# Altium footprint library WR-TBL_Rising Cage Clamp.PcbLib: 435 footprints (part 26 of 28)
Each footprint in its own frame and in the unit in brackets; x right, y up, seen from the top. Pads: shape width x height; smd on the part's side, far side on the other; paste and mask are expansions set on the pad; w line width, h text height; cw(c..) or ccw(c..) is an arc to the next point about the centre after c.
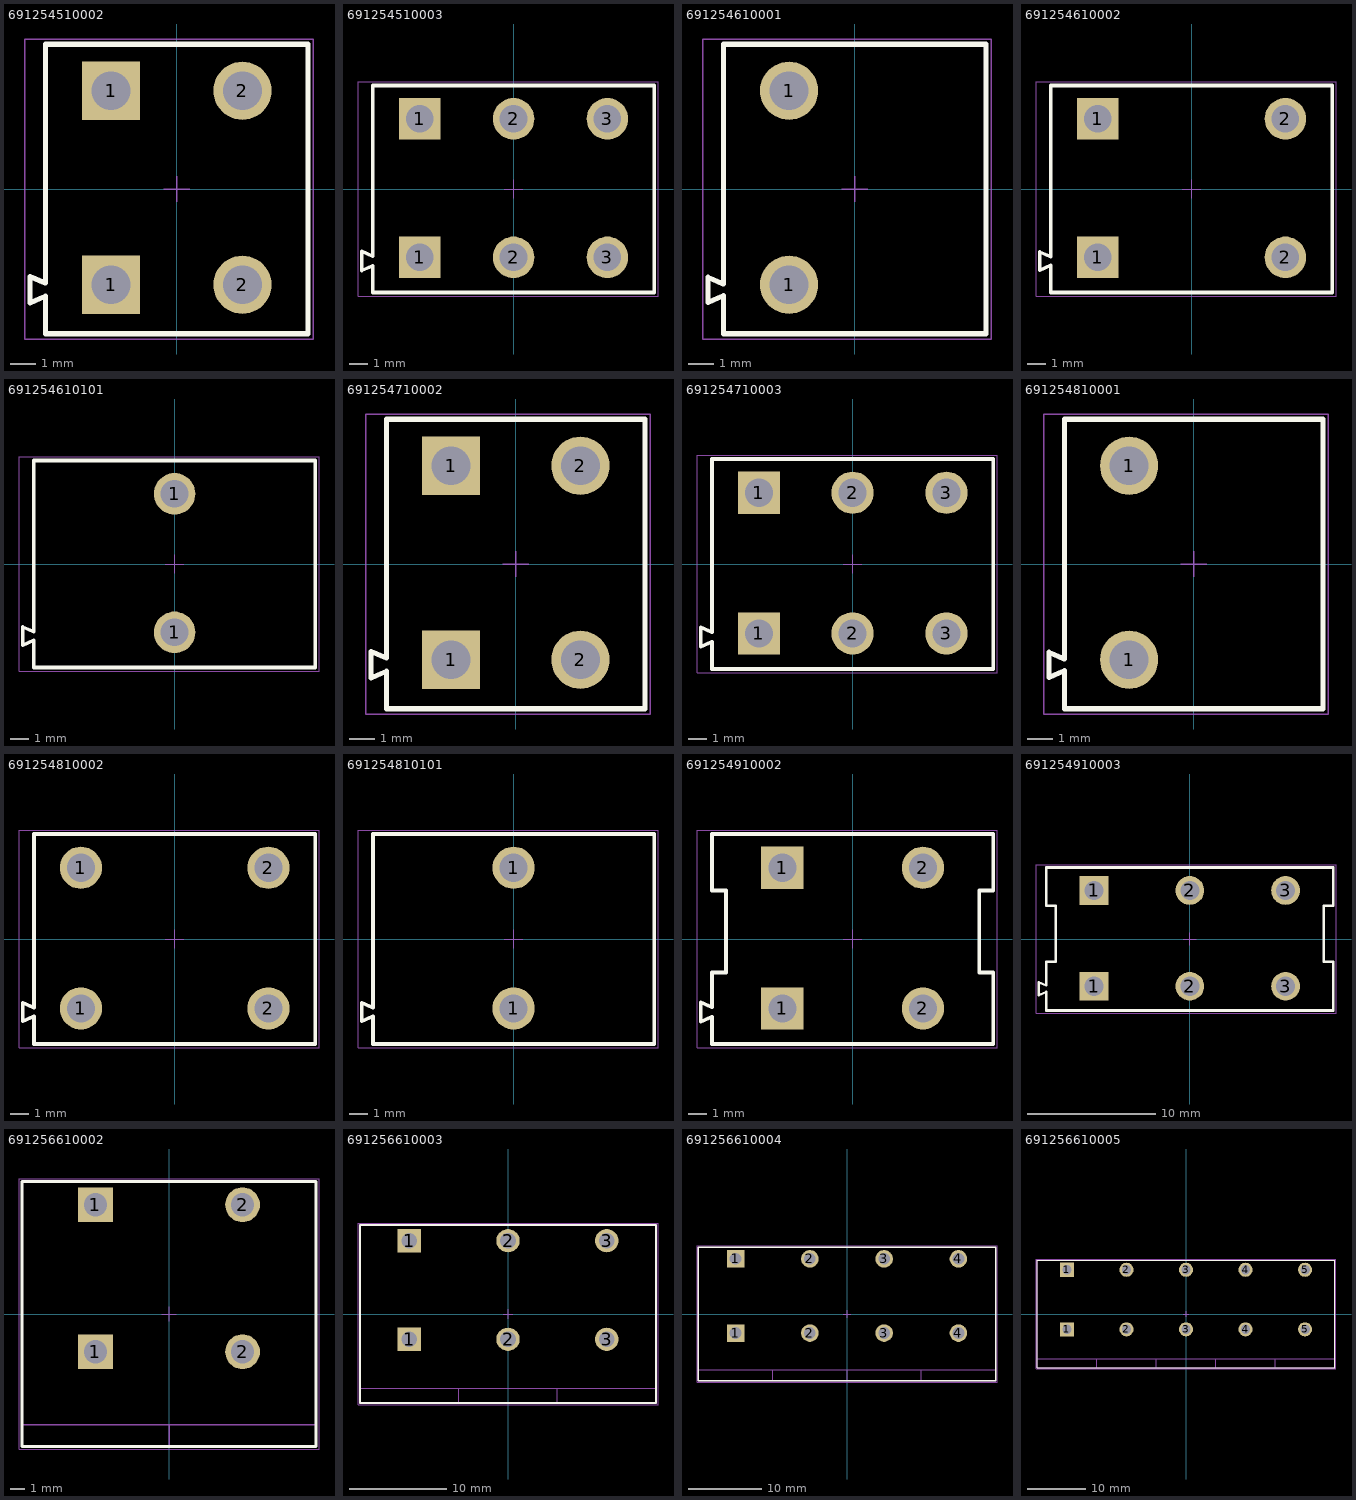
[diagram p25: the footprints below, top view; thin cyan lines are the x and y axes]

## 691254510002 [mm] "Serie 2545-5.08mm Horizontal Cable Entry with Rising Cage Clamp, 2 pins"
height 18
pads (4):
  rect 2.25x2.25 hole 1.5: 1(-2.54,-3.7) 1(-2.54,3.8)
  round 2.25 hole 1.5: 2(2.54,-3.7) 2(2.54,3.8)
Top Overlay:
  lines w0.2: -5.08,-5.6 -5.08,-4.15 -5.68,-4.41 -5.68,-3.38 -5.08,-3.64 -5.08,5.6 5.08,5.6 5.08,-5.6 -5.08,-5.6
Mechanical 13:
  lines w0.1: -5.08,-5.6 -5.08,-4.15 -5.68,-4.41 -5.68,-3.38 -5.08,-3.64 -5.08,5.6 5.08,5.6 5.08,-5.6 -5.08,-5.6
Mechanical 15:
  lines w0.05: -0.5,0 0.5,0 ; 0,-0.5 0,0.5 ; -5.88,-5.8 -5.88,5.8 5.28,5.8 5.28,-5.8 -5.88,-5.8
3D body "691254510002.stp": height 18.1, standoff -3.4, extent -5.68,-5.6 5.08,5.6

## 691254510003 [mm] "Serie 2545-5.08mm Horizontal Cable Entry with Rising Cage Clamp, 3 pins"
height 18
pads (6):
  rect 2.25x2.25 hole 1.5: 1(-5.08,-3.7) 1(-5.08,3.8)
  round 2.25 hole 1.5: 2(0,-3.7) 2(0,3.8) 3(5.08,-3.7) 3(5.08,3.8)
Top Overlay:
  lines w0.2: -7.62,-5.6 -7.62,-4.15 -8.22,-4.41 -8.22,-3.38 -7.62,-3.64 -7.62,5.6 7.62,5.6 7.62,-5.6 -7.62,-5.6
Mechanical 13:
  lines w0.1: -7.62,-5.6 -7.62,-4.15 -8.22,-4.41 -8.22,-3.38 -7.62,-3.64 -7.62,5.6 7.62,5.6 7.62,-5.6 -7.62,-5.6
Mechanical 15:
  lines w0.05: -0.5,0 0.5,0 ; 0,-0.5 0,0.5 ; -8.42,-5.8 7.82,-5.8 7.82,5.8 -8.42,5.8 -8.42,-5.8
3D body "691254510003.stp": height 18.1, standoff -3.4, extent -8.22,-5.6 7.62,5.6

## 691254610001 [mm] "Serie 2546-10.16mm Horizontal Cable Entry with Rising Cage Clamp, 1 pin"
height 18
pads (2):
  round 2.25 hole 1.5: 1(-2.54,-3.7) 1(-2.54,3.8)
Top Overlay:
  lines w0.2: -5.081,-4.127 -5.68,-4.39 -5.68,-3.41 -5.081,-3.673 -5.081,5.599 ; -5.08,-4.13 -5.08,-5.6 5.08,-5.6 5.08,5.6 -5.08,5.6
Mechanical 13:
  lines w0.1: -5.081,-4.127 -5.68,-4.39 -5.68,-3.41 -5.081,-3.673 -5.081,5.599 ; -5.08,-4.13 -5.08,-5.6 5.08,-5.6 5.08,5.6 -5.08,5.6
Mechanical 15:
  lines w0.05: -0.5,0 0.5,0 ; 0,-0.5 0,0.5 ; -5.88,-5.8 5.28,-5.8 5.28,5.8 -5.88,5.8 -5.88,-5.8
3D body "691254610001.stp": height 18.1, standoff -3.4, extent -5.68,-5.6 5.08,5.6

## 691254610002 [mm] "Serie 2546-10.16mm Horizontal Cable Entry with Rising Cage Clamp, 2 pins"
height 18
pads (4):
  rect 2.25x2.25 hole 1.5: 1(-5.08,-3.7) 1(-5.08,3.8)
  round 2.25 hole 1.5: 2(5.08,-3.7) 2(5.08,3.8)
Top Overlay:
  lines w0.2: -7.621,-4.127 -8.22,-4.39 -8.22,-3.41 -7.621,-3.673 -7.621,5.599 ; -7.62,-4.13 -7.62,-5.6 7.62,-5.6 7.62,5.6 -7.62,5.6
Mechanical 13:
  lines w0.1: -7.621,-4.127 -8.22,-4.39 -8.22,-3.41 -7.621,-3.673 -7.621,5.599 ; -7.62,-4.13 -7.62,-5.6 7.62,-5.6 7.62,5.6 -7.62,5.6
Mechanical 15:
  lines w0.05: -0.5,0 0.5,0 ; 0,-0.5 0,0.5 ; -8.42,-5.8 -8.42,5.8 7.82,5.8 7.82,-5.8 -8.42,-5.8
3D body "691254610002.stp": height 18.1, standoff -3.4, extent -8.22,-5.6 7.62,5.6

## 691254610101 [mm] "Serie 2546-10.16mm Horizontal Cable Entry with Rising Cage Clamp, 1 pin"
height 18
pads (2):
  round 2.25 hole 1.5: 1(0,-3.7) 1(0,3.8)
Top Overlay:
  lines w0.2: -7.621,-4.127 -8.22,-4.39 -8.22,-3.41 -7.621,-3.673 -7.621,5.599 ; -7.62,-4.13 -7.62,-5.6 7.62,-5.6 7.62,5.6 -7.62,5.6
Mechanical 13:
  lines w0.1: -7.621,-4.127 -8.22,-4.39 -8.22,-3.41 -7.621,-3.673 -7.621,5.599 ; -7.62,-4.13 -7.62,-5.6 7.62,-5.6 7.62,5.6 -7.62,5.6
Mechanical 15:
  lines w0.05: -0.5,0 0.5,0 ; 0,-0.5 0,0.5 ; -8.42,-5.8 7.82,-5.8 7.82,5.8 -8.42,5.8 -8.42,-5.8
3D body "691254610101.stp": height 18.1, standoff -3.4, extent -8.22,-5.6 7.62,5.6

## 691254710002 [mm] "Serie 2547-5.00mm Horizontal Cable Entry with Rising Cage Clamp, 2 pins"
height 18
pads (4):
  rect 2.25x2.25 hole 1.5: 1(-2.5,-3.7) 1(-2.5,3.8)
  round 2.25 hole 1.5: 2(2.5,-3.7) 2(2.5,3.8)
Top Overlay:
  lines w0.2: -5.6,-4.41 -5,-4.15 -5,-5.6 5,-5.6 5,5.6 -5,5.6 -5,-3.64 -5.6,-3.38 -5.6,-4.41
Mechanical 13:
  lines w0.1: -5.6,-4.41 -5.6,-3.38 -5,-3.64 -5,5.6 5,5.6 5,-5.6 -5,-5.6 -5,-4.15 -5.6,-4.41
Mechanical 15:
  lines w0.05: -0.5,0 0.5,0 ; 0,-0.5 0,0.5 ; -5.8,-5.8 -5.8,5.8 5.2,5.8 5.2,-5.8 -5.8,-5.8
3D body "691254710002.stp": height 18.05, standoff -3.45, extent -5.6,-5.6 5,5.6

## 691254710003 [mm] "Serie 2547-5.00mm Horizontal Cable Entry with Rising Cage Clamp, 3 pins"
height 18
pads (6):
  rect 2.25x2.25 hole 1.5: 1(-5,-3.7) 1(-5,3.8)
  round 2.25 hole 1.5: 2(0,-3.7) 2(0,3.8) 3(5,-3.7) 3(5,3.8)
Top Overlay:
  lines w0.2: -8.1,-4.41 -8.1,-3.38 -7.5,-3.64 -7.5,5.6 7.5,5.6 7.5,-5.6 -7.5,-5.6 -7.5,-4.15 -8.1,-4.41
Mechanical 13:
  lines w0.1: -8.1,-4.41 -7.5,-4.15 -7.5,-5.6 7.5,-5.6 7.5,5.6 -7.5,5.6 -7.5,-3.64 -8.1,-3.38 -8.1,-4.41
Mechanical 15:
  lines w0.05: -0.5,0 0.5,0 ; 0,-0.5 0,0.5 ; -8.3,-5.8 7.7,-5.8 7.7,5.8 -8.3,5.8 -8.3,-5.8
3D body "691254710003.stp": height 18.05, standoff -3.45, extent -8.1,-5.6 7.5,5.6

## 691254810001 [mm] "Serie 2548-10.00mm Horizontal Cable Entry with Rising Cage Clamp, 1 pin"
height 18
pads (2):
  round 2.25 hole 1.5: 1(-2.5,-3.7) 1(-2.5,3.8)
Top Overlay:
  lines w0.2: -5.001,-4.128 -5.6,-4.39 -5.6,-3.41 -5.001,-3.672 -5.001,5.599 5,5.6 5,-5.6 -5,-5.6 -5,-4.13
Mechanical 13:
  lines w0.1: -5.001,-4.128 -5.6,-4.39 -5.6,-3.41 -5.001,-3.672 -5.001,5.599 5,5.6 5,-5.6 -5,-5.6 -5,-4.13
Mechanical 15:
  lines w0.05: -0.5,0 0.5,0 ; 0,-0.5 0,0.5 ; -5.8,-5.8 -5.8,5.8 5.2,5.8 5.2,-5.8 -5.8,-5.8
3D body "691254810001.stp": height 18.1, standoff -3.4, extent -5.6,-5.6 5,5.6

## 691254810002 [mm] "Serie 2548-10.00mm Horizontal Cable Entry with Rising Cage Clamp, 2 pins"
height 18
pads (4):
  round 2.25 hole 1.5: 1(-5,-3.7) 1(-5,3.8) 2(5,-3.7) 2(5,3.8)
Top Overlay:
  lines w0.2: -7.5,-4.13 -7.5,-5.6 7.5,-5.6 7.5,5.6 -7.5,5.6 -7.5,-3.672 -8.1,-3.41 -8.1,-4.39 -7.501,-4.128
Mechanical 13:
  lines w0.1: -7.5,-4.13 -7.5,-5.6 7.5,-5.6 7.5,5.6 -7.501,5.6 -7.501,-3.672 -8.1,-3.41 -8.1,-4.39 -7.501,-4.128
Mechanical 15:
  lines w0.05: -0.5,0 0.5,0 ; 0,-0.5 0,0.5 ; -8.3,-5.8 7.7,-5.8 7.7,5.8 -8.3,5.8 -8.3,-5.8
3D body "691254810002.stp": height 18.1, standoff -3.4, extent -8.1,-5.6 7.5,5.6

## 691254810101 [mm] "Serie 2548-10.00mm Horizontal Cable Entry with Rising Cage Clamp, 1 pin"
height 18
pads (2):
  round 2.25 hole 1.5: 1(0,-3.7) 1(0,3.8)
Top Overlay:
  lines w0.2: -7.5,-4.13 -7.5,-5.6 7.5,-5.6 7.5,5.6 -7.5,5.6 -7.5,-3.672 -8.1,-3.41 -8.1,-4.39 -7.501,-4.128
Mechanical 13:
  lines w0.1: -7.5,-4.13 -7.5,-5.6 7.5,-5.6 7.5,5.6 -7.501,5.6 -7.501,-3.672 -8.1,-3.41 -8.1,-4.39 -7.501,-4.128
Mechanical 15:
  lines w0.05: -0.5,0 0.5,0 ; 0,-0.5 0,0.5 ; -8.3,-5.8 -8.3,5.8 7.7,5.8 7.7,-5.8 -8.3,-5.8
3D body "691254810101.stp": height 18.1, standoff -3.4, extent -8.1,-5.6 7.5,5.6

## 691254910002 [mm] "Serie 2549-7.50mm Horizontal Cable Entry with Rising Cage Clamp, 2 pins"
height 18
pads (4):
  rect 2.25x2.25 hole 1.5: 1(-3.75,-3.7) 1(-3.75,3.8)
  round 2.25 hole 1.5: 2(3.75,-3.7) 2(3.75,3.8)
Top Overlay:
  lines w0.2: -8.1,-4.41 -8.1,-3.38 -7.5,-3.64 -7.5,-1.79 -6.75,-1.79 -6.75,2.59 -7.5,2.59 -7.5,5.6 7.5,5.6 7.5,2.59 6.75,2.59 6.75,-1.79 7.5,-1.79 7.5,-5.6 -7.5,-5.6 -7.5,-4.15 -8.1,-4.41
Mechanical 13:
  lines w0.1: -8.1,-4.41 -7.5,-4.15 -7.5,-5.6 7.5,-5.6 7.5,-1.79 6.75,-1.79 6.75,2.59 7.5,2.59 7.5,5.6 -7.5,5.6 -7.5,2.59 -6.75,2.59 -6.75,-1.79 -7.5,-1.79 -7.5,-3.64 -8.1,-3.38 -8.1,-4.41
Mechanical 15:
  lines w0.05: -0.5,0 0.5,0 ; 0,-0.5 0,0.5 ; -8.3,-5.8 -8.3,5.8 7.7,5.8 7.7,-5.8 -8.3,-5.8
3D body "691254910002.stp": height 18.1, standoff -3.4, extent -8.1,-5.6 7.5,5.6

## 691254910003 [mm] "Serie 2549-7.50mm Horizontal Cable Entry with Rising Cage Clamp, 3 pins"
height 18
pads (6):
  rect 2.25x2.25 hole 1.5: 1(-7.5,-3.7) 1(-7.5,3.8)
  round 2.25 hole 1.5: 2(0,-3.7) 2(0,3.8) 3(7.5,-3.7) 3(7.5,3.8)
Top Overlay:
  lines w0.2: -11.85,-4.41 -11.25,-4.15 -11.25,-5.6 11.25,-5.6 11.25,-1.79 10.5,-1.79 10.5,2.59 11.25,2.59 11.25,5.6 -11.25,5.6 -11.25,2.59 -10.5,2.59 -10.5,-1.79 -11.25,-1.79 -11.25,-3.64 -11.85,-3.38 -11.85,-4.41
Mechanical 13:
  lines w0.1: -11.85,-4.41 -11.85,-3.38 -11.25,-3.64 -11.25,-1.79 -10.5,-1.79 -10.5,2.59 -11.25,2.59 -11.25,5.6 11.25,5.6 11.25,2.59 10.5,2.59 10.5,-1.79 11.25,-1.79 11.25,-5.6 -11.25,-5.6 -11.25,-4.15 -11.85,-4.41
Mechanical 15:
  lines w0.05: -0.5,0 0.5,0 ; 0,-0.5 0,0.5 ; -12.05,-5.8 11.45,-5.8 11.45,5.8 -12.05,5.8 -12.05,-5.8
3D body "691254910003.stp": height 18.1, standoff -3.4, extent -11.85,-5.6 11.25,5.6

## 691256610002 [mm] "10.16mm Horizontal Cable Entry with Rising Cage Clamp, 02p"
height 29.3
pads (4):
  rect 2.4x2.4 hole 1.6: 1(-5.08,-2.61) 1(-5.08,7.55)
  round 2.4 hole 1.6: 2(5.08,-2.61) 2(5.08,7.55)
Top Overlay:
  lines w0.2: -10.16,-9.15 -10.16,9.15 10.16,9.15 10.16,-9.15 -10.16,-9.15
Mechanical 13:
  lines w0.1: -10.16,-7.65 10.16,-7.65 ; 0,-9.15 0,-7.65 ; -10.16,-9.15 10.16,-9.15 10.16,9.15 -10.16,9.15 -10.16,-9.15
Mechanical 15:
  lines w0.05: -0.5,0 0.5,0 ; 0,-0.5 0,0.5 ; -10.36,-9.35 -10.36,9.35 10.36,9.35 10.36,-9.35 -10.36,-9.35
3D body "691256610002.stp": height 29.33, standoff -4.97, extent -10.16,-9.15 10.16,9.15

## 691256610003 [mm] "10.16mm Horizontal Cable Entry with Rising Cage Clamp, 03p"
height 29.3
pads (6):
  rect 2.4x2.4 hole 1.6: 1(-10.16,-2.61) 1(-10.16,7.55)
  round 2.4 hole 1.6: 2(0,-2.61) 2(0,7.55) 3(10.16,-2.61) 3(10.16,7.55)
Top Overlay:
  lines w0.2: -15.24,-9.15 -15.24,9.15 15.24,9.15 15.24,-9.15 -15.24,-9.15
Mechanical 13:
  lines w0.1: -15.24,-7.65 15.24,-7.65 ; -5.08,-9.15 -5.08,-7.65 ; 5.08,-9.15 5.08,-7.65 ; -15.24,-9.15 15.24,-9.15 15.24,9.15 -15.24,9.15 -15.24,-9.15
Mechanical 15:
  lines w0.05: -0.5,0 0.5,0 ; 0,-0.5 0,0.5 ; -15.44,-9.35 -15.44,9.35 15.44,9.35 15.44,-9.35 -15.44,-9.35
3D body "691256610003.stp": height 29.33, standoff -4.97, extent -15.24,-9.15 15.24,9.15

## 691256610004 [mm] "10.16mm Horizontal Cable Entry with Rising Cage Clamp, 04p"
height 29.3
pads (8):
  rect 2.4x2.4 hole 1.6: 1(-15.24,-2.61) 1(-15.24,7.55)
  round 2.4 hole 1.6: 2(-5.08,-2.61) 2(-5.08,7.55) 3(5.08,-2.61) 3(5.08,7.55) 4(15.24,-2.61) 4(15.24,7.55)
Top Overlay:
  lines w0.2: -20.32,-9.15 -20.32,9.15 20.32,9.15 20.32,-9.15 -20.32,-9.15
Mechanical 13:
  lines w0.1: -20.32,-7.65 20.32,-7.65 ; -10.16,-9.15 -10.16,-7.65 ; 0,-9.15 0,-7.65 ; 10.16,-9.15 10.16,-7.65 ; -20.32,-9.15 20.32,-9.15 20.32,9.15 -20.32,9.15 -20.32,-9.15
Mechanical 15:
  lines w0.05: -0.5,0 0.5,0 ; 0,-0.5 0,0.5 ; -20.52,-9.35 -20.52,9.35 20.52,9.35 20.52,-9.35 -20.52,-9.35
3D body "691256610004.stp": height 29.33, standoff -4.97, extent -20.32,-9.15 20.32,9.15

## 691256610005 [mm] "10.16mm Horizontal Cable Entry with Rising Cage Clamp, 05p"
height 29.3
pads (10):
  rect 2.4x2.4 hole 1.6: 1(-20.32,-2.61) 1(-20.32,7.55)
  round 2.4 hole 1.6: 2(-10.16,-2.61) 2(-10.16,7.55) 3(0,-2.61) 3(0,7.55) 4(10.16,-2.61) 4(10.16,7.55) 5(20.32,-2.61) 5(20.32,7.55)
Top Overlay:
  lines w0.2: -25.4,-9.15 -25.4,9.15 25.4,9.15 25.4,-9.15 -25.4,-9.15
Mechanical 13:
  lines w0.1: -25.4,-7.65 25.4,-7.65 ; -15.24,-9.15 -15.24,-7.65 ; -5.08,-9.15 -5.08,-7.65 ; 5.08,-9.15 5.08,-7.65 ; 15.24,-9.15 15.24,-7.65 ; -25.4,-9.15 25.4,-9.15 25.4,9.15 -25.4,9.15 -25.4,-9.15
Mechanical 15:
  lines w0.05: -0.5,0 0.5,0 ; 0,-0.5 0,0.5 ; -25.6,-9.35 -25.6,9.35 25.6,9.35 25.6,-9.35 -25.6,-9.35
3D body "691256610005.stp": height 29.33, standoff -4.97, extent -25.4,-9.15 25.4,9.15